# Altium footprint library General.PCBLIB: 231 footprints (part 7 of 15)
Each footprint in its own frame and in the unit in brackets; x right, y up, seen from the top. Pads: shape width x height; smd on the part's side, far side on the other; paste and mask are expansions set on the pad; w line width, h text height; cw(c..) or ccw(c..) is an arc to the next point about the centre after c.
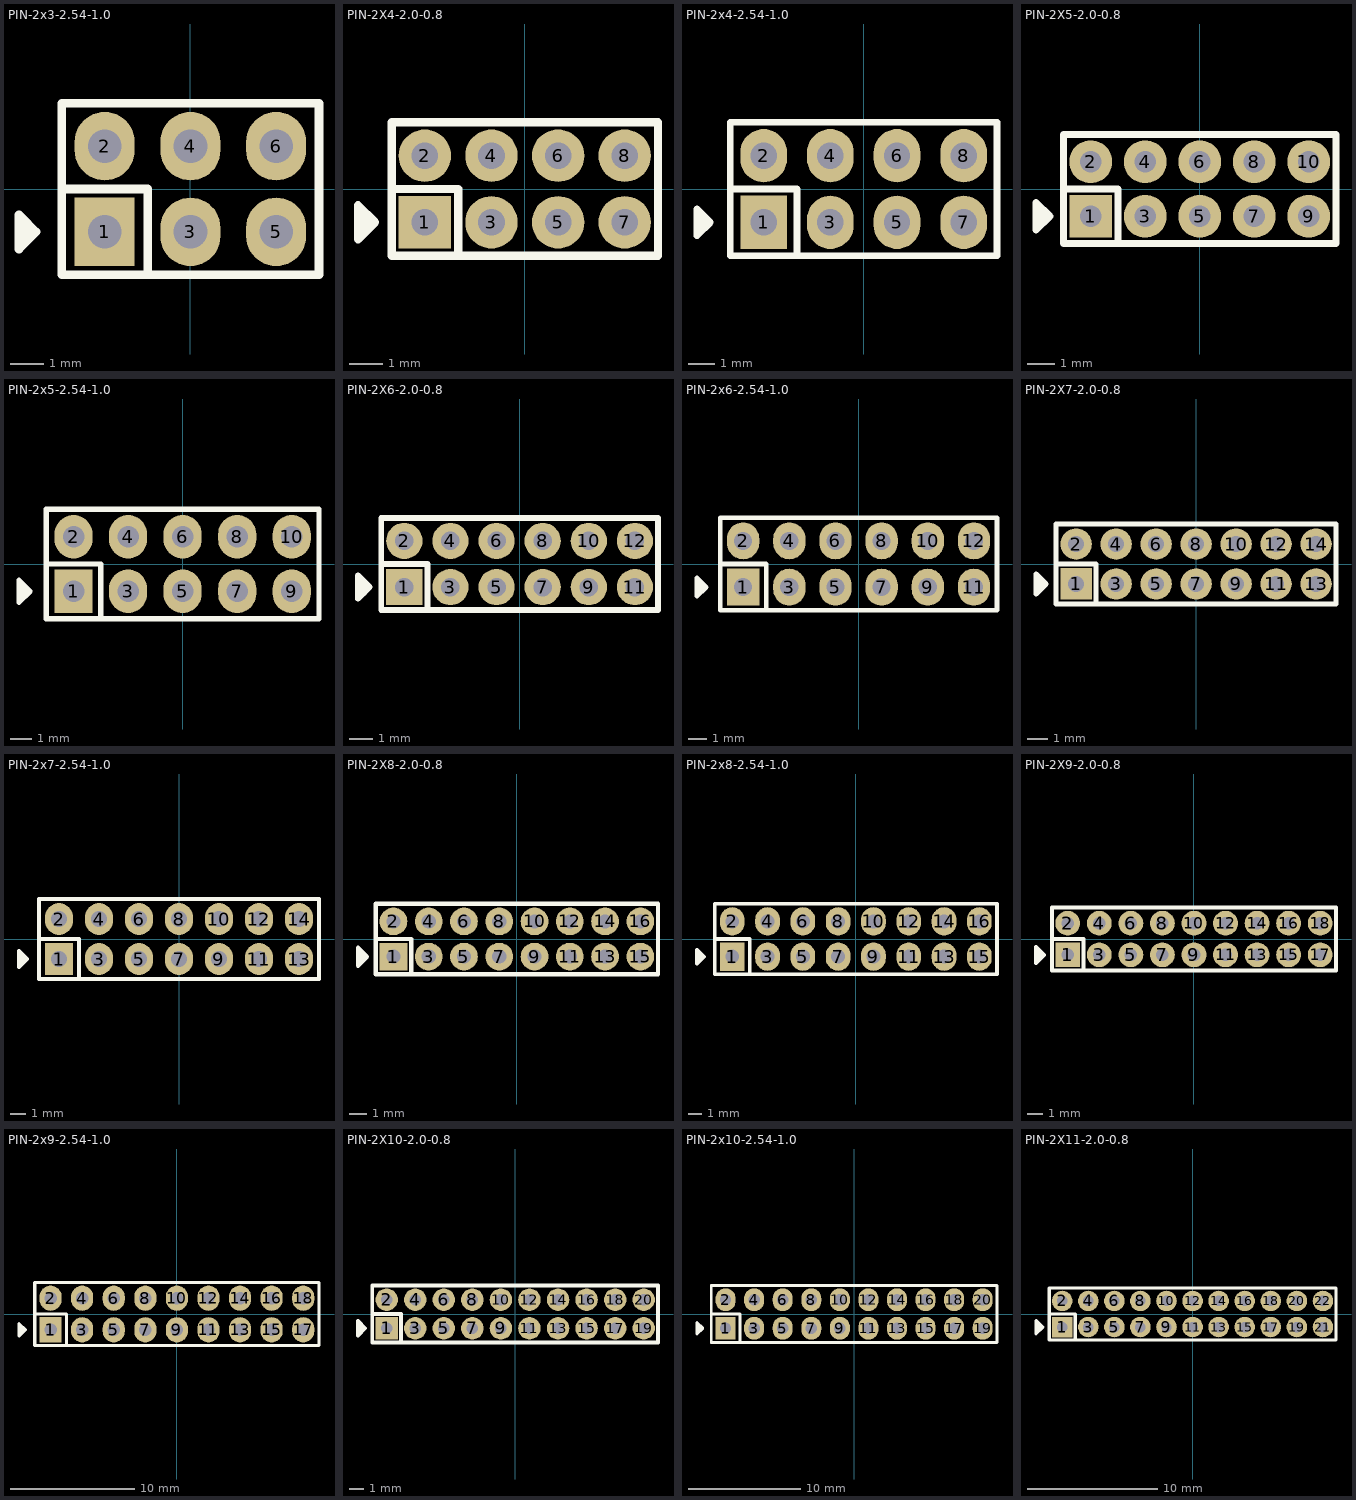
[diagram p6: the footprints below, top view; thin cyan lines are the x and y axes]

## PIN-2x3-2.54-1.0 [mil] "Pin Header"
height 374.02
pads (6):
  rect 70x80 hole 39.37: 1(-100,-50)
  oval 70x80 hole 39.37: 2(-100,50) 3(0,-50) 4(0,50) 5(100,-50) 6(100,50)
Top Overlay:
  lines w10: -190,-60 -190,-40 ; -150,0 -50,0 -50,-100 ; -200,-70 -180,-50 -200,-30 -200,-70 ; -150,-100 -150,100 150,100 150,-100 -150,-100
3D body "PIN2X3_100mils.STEP": height 397.64, standoff -59.06, extent -150,-100 150,100

## PIN-2X4-2.0-0.8 [mm] "Pin Header"
height 3.8
pads (8):
  rect 1.575x1.575 hole 0.8: 1(-3,-1)
  round 1.575 hole 0.8: 2(-3,1) 3(-1,-1) 4(-1,1) 5(1,-1) 6(1,1) 7(3,-1) 8(3,1)
Top Overlay:
  lines w0.254: -4.754,-1.254 -4.754,-0.746 ; -4,0 -2,0 -2,-2 ; -5.008,-1.508 -4.5,-1 -5.008,-0.492 -5.008,-1.508 ; -4,-2 -4,2 4,2 4,-2 -4,-2
3D body "Samtec-MTMM-104-02-G-D-150.STEP": height 5.31, standoff -1.17, extent -4,-2 3.996,1.998

## PIN-2x4-2.54-1.0 [mil] "Pin Header"
height 374.02
pads (8):
  rect 70x80 hole 39.37: 1(-150,-50)
  oval 70x80 hole 39.37: 2(-150,50) 3(-50,-50) 4(-50,50) 5(50,-50) 6(50,50) 7(150,-50) 8(150,50)
Top Overlay:
  lines w10: -240,-60 -240,-40 ; -200,0 -100,0 -100,-100 ; -250,-70 -250,-30 -230,-50 -250,-70 ; -200,-100 200,-100 200,100 -200,100 -200,-100
3D body "PIN2X4_100mils.STEP": height 397.64, standoff -59.06, extent -200,-100 200,100

## PIN-2X5-2.0-0.8 [mm] "Pin Header"
height 3.8
pads (10):
  rect 1.575x1.575 hole 0.8: 1(-4,-1)
  round 1.575 hole 0.8: 2(-4,1) 3(-2,-1) 4(-2,1) 5(0,-1) 6(0,1) 7(2,-1) 8(2,1) 9(4,-1) 10(4,1)
Top Overlay:
  lines w0.254: -5.754,-1.254 -5.754,-0.746 ; -5,0 -3,0 -3,-2 ; -6.008,-1.508 -6.008,-0.492 -5.5,-1 -6.008,-1.508 ; -5,-2 5,-2 5,2 -5,2 -5,-2
3D body "Samtec-MTMM-105-02-G-D-150.STEP": height 5.31, standoff -1.17, extent -5,-2 4.995,1.998

## PIN-2x5-2.54-1.0 [mil] "Pin Header"
height 374.02
pads (10):
  rect 70x80 hole 39.37: 1(-200,-50)
  oval 70x80 hole 39.37: 2(-200,50) 3(-100,-50) 4(-100,50) 5(0,-50) 6(0,50) 7(100,-50) 8(100,50) 9(200,-50) 10(200,50)
Top Overlay:
  lines w10: -290,-60 -290,-40 ; -250,0 -150,0 -150,-100 ; -300,-70 -280,-50 -300,-30 -300,-70 ; -250,-100 -250,100 250,100 250,-100 -250,-100
3D body "PIN2X5_100mils.STEP": height 397.64, standoff -59.06, extent -250,-100 250,100

## PIN-2X6-2.0-0.8 [mm] "Pin Header"
height 3.8
pads (12):
  rect 1.575x1.575 hole 0.8: 1(-5,-1)
  round 1.575 hole 0.8: 2(-5,1) 3(-3,-1) 4(-3,1) 5(-1,-1) 6(-1,1) 7(1,-1) 8(1,1) 9(3,-1) 10(3,1) 11(5,-1) 12(5,1)
Top Overlay:
  lines w0.254: -6.754,-1.254 -6.754,-0.746 ; -6,0 -4,0 -4,-2 ; -7.008,-1.508 -7.008,-0.492 -6.5,-1 -7.008,-1.508 ; -6,-2 6,-2 6,2 -6,2 -6,-2
3D body "Samtec-MTMM-106-02-G-D-150.STEP": height 5.31, standoff -1.17, extent -6,-2 5.994,1.998

## PIN-2x6-2.54-1.0 [mil] "Pin Header"
height 374.02
pads (12):
  rect 70x80 hole 39.37: 1(-250,-50)
  oval 70x80 hole 39.37: 2(-250,50) 3(-150,-50) 4(-150,50) 5(-50,-50) 6(-50,50) 7(50,-50) 8(50,50) 9(150,-50) 10(150,50) 11(250,-50) 12(250,50)
Top Overlay:
  lines w10: -340,-60 -340,-40 ; -300,0 -200,0 -200,-100 ; -350,-70 -330,-50 -350,-30 -350,-70 ; -300,-100 -300,100 300,100 300,-100 -300,-100
3D body "PIN2X6_100mils.STEP": height 397.64, standoff -59.06, extent -300,-100 300,100

## PIN-2X7-2.0-0.8 [mm] "Pin Header"
height 3.8
pads (14):
  rect 1.575x1.575 hole 0.8: 1(-6,-1)
  round 1.575 hole 0.8: 2(-6,1) 3(-4,-1) 4(-4,1) 5(-2,-1) 6(-2,1) 7(0,-1) 8(0,1) 9(2,-1) 10(2,1) 11(4,-1) 12(4,1) 13(6,-1) 14(6,1)
Top Overlay:
  lines w0.254: -7.754,-1.254 -7.754,-0.746 ; -7,0 -5,0 -5,-2 ; -8.008,-1.508 -8.008,-0.492 -7.5,-1 -8.008,-1.508 ; -7,-2 7,-2 7,2 -7,2 -7,-2
3D body "Samtec-MTMM-107-02-G-D-150.STEP": height 5.31, standoff -1.17, extent -7,-2 6.993,1.998

## PIN-2x7-2.54-1.0 [mil] "Pin Header"
height 374.02
pads (14):
  rect 70x80 hole 39.37: 1(-300,-50)
  oval 70x80 hole 39.37: 2(-300,50) 3(-200,-50) 4(-200,50) 5(-100,-50) 6(-100,50) 7(0,-50) 8(0,50) 9(100,-50) 10(100,50) 11(200,-50) 12(200,50) 13(300,-50) 14(300,50)
Top Overlay:
  lines w10: -390,-60 -390,-40 ; -350,0 -250,0 -250,-100 ; -400,-70 -380,-50 -400,-30 -400,-70 ; -350,-100 -350,100 350,100 350,-100 -350,-100
3D body "PIN2X7_100mils.STEP": height 397.64, standoff -59.06, extent -350,-100 350,100

## PIN-2X8-2.0-0.8 [mm] "Pin Header"
height 3.8
pads (16):
  rect 1.575x1.575 hole 0.8: 1(-7,-1)
  round 1.575 hole 0.8: 2(-7,1) 3(-5,-1) 4(-5,1) 5(-3,-1) 6(-3,1) 7(-1,-1) 8(-1,1) 9(1,-1) 10(1,1) 11(3,-1) 12(3,1) 13(5,-1) 14(5,1) 15(7,-1) 16(7,1)
Top Overlay:
  lines w0.254: -8.754,-1.254 -8.754,-0.746 ; -8,0 -6,0 -6,-2 ; -9.008,-1.508 -8.5,-1 -9.008,-0.492 -9.008,-1.508 ; -8,-2 -8,2 8,2 8,-2 -8,-2
3D body "Samtec-MTMM-108-02-G-D-150.STEP": height 5.31, standoff -1.17, extent -8,-2 7.992,1.998

## PIN-2x8-2.54-1.0 [mil] "Pin Header"
height 374.02
pads (16):
  rect 70x80 hole 39.37: 1(-350,-50)
  oval 70x80 hole 39.37: 2(-350,50) 3(-250,-50) 4(-250,50) 5(-150,-50) 6(-150,50) 7(-50,-50) 8(-50,50) 9(50,-50) 10(50,50) 11(150,-50) 12(150,50) 13(250,-50) 14(250,50) 15(350,-50) 16(350,50)
Top Overlay:
  lines w10: -440,-60 -440,-40 ; -400,0 -300,0 -300,-100 ; -450,-70 -430,-50 -450,-30 -450,-70 ; -400,-100 -400,100 400,100 400,-100 -400,-100
3D body "PIN2X8_100mils.STEP": height 397.64, standoff -59.06, extent -400,-100 400,100

## PIN-2X9-2.0-0.8 [mm] "Pin Header"
height 3.8
pads (18):
  rect 1.575x1.575 hole 0.8: 1(-8,-1)
  round 1.575 hole 0.8: 2(-8,1) 3(-6,-1) 4(-6,1) 5(-4,-1) 6(-4,1) 7(-2,-1) 8(-2,1) 9(0,-1) 10(0,1) 11(2,-1) 12(2,1) 13(4,-1) 14(4,1) 15(6,-1) 16(6,1) 17(8,-1) 18(8,1)
Top Overlay:
  lines w0.254: -9.754,-1.254 -9.754,-0.746 ; -9,0 -7,0 -7,-2 ; -10.008,-1.508 -9.5,-1 -10.008,-0.492 -10.008,-1.508 ; -9,-2 -9,2 9,2 9,-2 -9,-2
3D body "Samtec-MTMM-109-02-G-D-150.STEP": height 5.31, standoff -1.17, extent -9,-2 8.991,1.998

## PIN-2x9-2.54-1.0 [mil] "Pin Header"
height 374.02
pads (18):
  rect 70x80 hole 39.37: 1(-400,-50)
  oval 70x80 hole 39.37: 2(-400,50) 3(-300,-50) 4(-300,50) 5(-200,-50) 6(-200,50) 7(-100,-50) 8(-100,50) 9(0,-50) 10(0,50) 11(100,-50) 12(100,50) 13(200,-50) 14(200,50) 15(300,-50) 16(300,50) 17(400,-50) 18(400,50)
Top Overlay:
  lines w10: -490,-60 -490,-40 ; -450,0 -350,0 -350,-100 ; -500,-70 -480,-50 -500,-30 -500,-70 ; -450,-100 -450,100 450,100 450,-100 -450,-100
3D body "PIN2X9_100mils.STEP": height 397.64, standoff -59.06, extent -450,-100 450,100

## PIN-2X10-2.0-0.8 [mm] "Pin Header"
height 3.8
pads (20):
  rect 1.575x1.575 hole 0.8: 1(-9,-1)
  round 1.575 hole 0.8: 2(-9,1) 3(-7,-1) 4(-7,1) 5(-5,-1) 6(-5,1) 7(-3,-1) 8(-3,1) 9(-1,-1) 10(-1,1) 11(1,-1) 12(1,1) 13(3,-1) 14(3,1) 15(5,-1) 16(5,1) 17(7,-1) 18(7,1) 19(9,-1) 20(9,1)
Top Overlay:
  lines w0.254: -10.754,-1.254 -10.754,-0.746 ; -10,0 -8,0 -8,-2 ; -11.008,-1.508 -10.5,-1 -11.008,-0.492 -11.008,-1.508 ; -10,-2 -10,2 10,2 10,-2 -10,-2
3D body "Samtec-MTMM-110-02-G-D-150.STEP": height 5.31, standoff -1.17, extent -10,-2 9.99,1.998

## PIN-2x10-2.54-1.0 [mil] "Pin Header"
height 374.02
pads (20):
  rect 70x80 hole 39.37: 1(-450,-50)
  oval 70x80 hole 39.37: 2(-450,50) 3(-350,-50) 4(-350,50) 5(-250,-50) 6(-250,50) 7(-150,-50) 8(-150,50) 9(-50,-50) 10(-50,50) 11(50,-50) 12(50,50) 13(150,-50) 14(150,50) 15(250,-50) 16(250,50) 17(350,-50) 18(350,50) 19(450,-50) 20(450,50)
Top Overlay:
  lines w10: -540,-60 -540,-40 ; -500,0 -400,0 -400,-100 ; -550,-70 -530,-50 -550,-30 -550,-70 ; -500,-100 -500,100 500,100 500,-100 -500,-100
3D body "PIN2X10_100mils.STEP": height 397.64, standoff -59.06, extent -500,-100 500,100

## PIN-2X11-2.0-0.8 [mm] "Pin Header"
height 3.8
pads (22):
  rect 1.575x1.575 hole 0.8: 1(-10,-1)
  round 1.575 hole 0.8: 2(-10,1) 3(-8,-1) 4(-8,1) 5(-6,-1) 6(-6,1) 7(-4,-1) 8(-4,1) 9(-2,-1) 10(-2,1) 11(0,-1) 12(0,1) 13(2,-1) 14(2,1) 15(4,-1) 16(4,1) 17(6,-1) 18(6,1) 19(8,-1) 20(8,1) 21(10,-1) 22(10,1)
Top Overlay:
  lines w0.254: -11.754,-1.254 -11.754,-0.746 ; -11,0 -9,0 -9,-2 ; -12.008,-1.508 -11.5,-1 -12.008,-0.492 -12.008,-1.508 ; -11,-2 -11,2 11,2 11,-2 -11,-2
3D body "Samtec-MTMM-111-02-G-D-150.STEP": height 5.31, standoff -1.17, extent -11,-2 10.989,1.998